# Altium footprint library texas.PCBLIB: 168 footprints (part 11 of 14)
Each footprint in its own frame and in the unit in brackets; x right, y up, seen from the top. Pads: shape width x height; smd on the part's side, far side on the other; paste and mask are expansions set on the pad; w line width, h text height; cw(c..) or ccw(c..) is an arc to the next point about the centre after c.
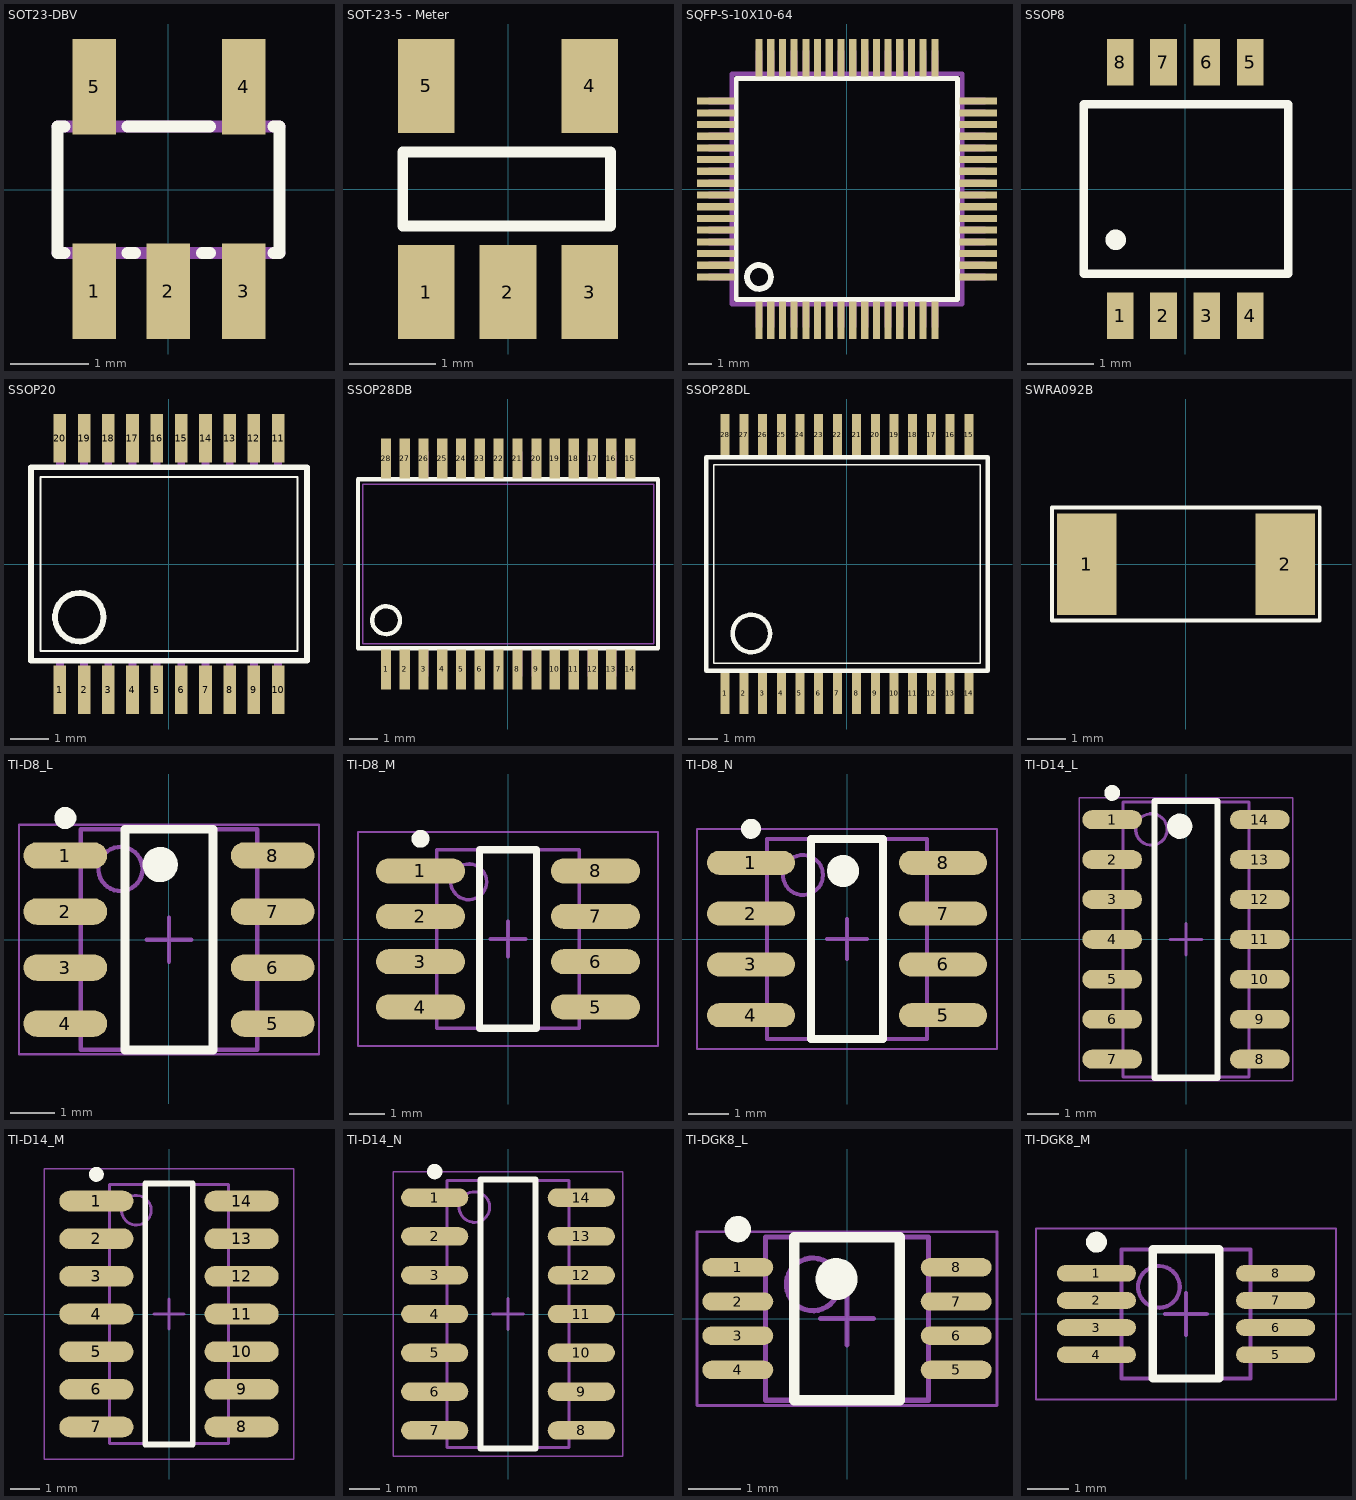
[diagram p10: the footprints below, top view; thin cyan lines are the x and y axes]

## SOT23-DBV [mil]
pads (5):
  rect 22x48 smd: 1(-37.4,-51.18) 2(0,-51.18) 3(38,-51.18) 4(38,52) 5(-37.4,52)
Top Overlay:
  lines w6: -52.28,-31.89 -55.98,-31.89 -55.98,32 -52.28,32 ; -20.55,-31.89 -16.85,-31.89 ; -20.55,32 21,32 ; 17,-31.89 21,-31.89 ; 53,-31.89 56,-31.89 56,32 53,32
Mechanical 4:
  rectangle: -47.24,34 -27.56,60
  rectangle: 28,34 48,60
  rectangle: 28,-59.06 48,-33.46
  rectangle: -9.84,-59.06 10,-33.46
  rectangle: -47.24,-59.06 -27.56,-33.46
  lines w6: -55.98,-31.89 56,-31.89 ; -55.98,32 56,32

## SOT-23-5 - Meter [mm]
pads (5):
  rect 0.66x1.092 smd: 1(-0.95,-1.2) 2(0,-1.2) 3(0.95,-1.2) 4(0.95,1.2) 5(-0.95,1.2)
Top Overlay:
  lines w0.127: -1.225,-0.43 -1.225,0.43 1.194,0.43 1.194,-0.43 -1.225,-0.43
3D body "CircuitWorks-SOT-23-5.step": height 1.07, standoff -0.03, extent -1.495,-1.27 1.505,1.23

## SQFP-S-10X10-64 [mil]
pads (64):
  rect 12x63 smd: 1(-147.64,-220.47) 2(-127.95,-220.47) 3(-108.27,-220.47) 4(-88.58,-220.47) 5(-68.9,-220.47) 6(-49.21,-220.47) 7(-29.53,-220.47) 8(-9.84,-220.47) 9(10,-220.47) 10(30,-220.47) 11(50,-220.47) 12(69,-220.47) 13(89,-220.47) 14(109,-220.47) 15(128,-220.47) 16(148,-220.47) 33(148,221) 34(128,221) 35(109,221) 36(89,221) 37(69,221) 38(50,221) 39(30,221) 40(10,221) 41(-9.84,221) 42(-29.53,221) 43(-49.21,221) 44(-68.9,221) 45(-88.58,221) 46(-108.27,221) 47(-127.95,221) 48(-147.64,221)
  rect 63x12 smd: 17(221,-147.64) 18(221,-127.95) 19(221,-108.27) 20(221,-88.58) 21(221,-68.9) 22(221,-49.21) 23(221,-29.53) 24(221,-9.84) 25(221,10) 26(221,30) 27(221,50) 28(221,69) 29(221,89) 30(221,109) 31(221,128) 32(221,148) 49(-220.47,148) 50(-220.47,128) 51(-220.47,109) 52(-220.47,89) 53(-220.47,69) 54(-220.47,50) 55(-220.47,30) 56(-220.47,10) 57(-220.47,-9.84) 58(-220.47,-29.53) 59(-220.47,-49.21) 60(-220.47,-68.9) 61(-220.47,-88.58) 62(-220.47,-108.27) 63(-220.47,-127.95) 64(-220.47,-147.64)
Top Overlay:
  circle w10: c-147.64,-147.64 r20
  lines w8: -185.83,-185.43 186,-185.43 186,186 -185.83,186 -185.83,-185.43
Mechanical 4:
  rectangle: -153.54,-232.28 -141.73,-194.88
  rectangle: -133.86,-232.28 -122.05,-194.88
  rectangle: -114.17,-232.28 -102.36,-194.88
  rectangle: -94.49,-232.28 -82.68,-194.88
  rectangle: -74.8,-232.28 -62.99,-194.88
  rectangle: -55.12,-232.28 -43.31,-194.88
  rectangle: -35.43,-232.28 -23.62,-194.88
  rectangle: -15.75,-232.28 -3.94,-194.88
  rectangle: 4,-232.28 16,-194.88
  rectangle: 24,-232.28 36,-194.88
  rectangle: 44,-232.28 56,-194.88
  rectangle: 63,-232.28 75,-194.88
  rectangle: 83,-232.28 95,-194.88
  rectangle: 103,-232.28 115,-194.88
  rectangle: 123,-232.28 134,-194.88
  rectangle: 142,-232.28 154,-194.88
  rectangle: 195,-153.54 233,-141.73
  rectangle: 195,-133.86 233,-122.05
  rectangle: 195,-114.17 233,-102.36
  rectangle: 195,-94.49 233,-82.68
  rectangle: 195,-74.8 233,-62.99
  rectangle: 195,-55.12 233,-43.31
  rectangle: 195,-35.43 233,-23.62
  rectangle: 195,-15.75 233,-3.94
  rectangle: 195,4 233,16
  rectangle: 195,24 233,36
  rectangle: 195,44 233,56
  rectangle: 195,63 233,75
  rectangle: 195,83 233,95
  rectangle: 195,103 233,115
  rectangle: 195,123 233,134
  rectangle: 195,142 233,154
  rectangle: 142,195 154,233
  rectangle: 123,195 134,233
  rectangle: 103,195 115,233
  rectangle: 83,195 95,233
  rectangle: 63,195 75,233
  rectangle: 44,195 56,233
  rectangle: 24,195 36,233
  rectangle: 4,195 16,233
  rectangle: -15.75,195 -3.94,233
  rectangle: -35.43,195 -23.62,233
  rectangle: -55.12,195 -43.31,233
  rectangle: -74.8,195 -62.99,233
  rectangle: -94.49,195 -82.68,233
  rectangle: -114.17,195 -102.36,233
  rectangle: -133.86,195 -122.05,233
  rectangle: -153.54,195 -141.73,233
  rectangle: -232.28,142 -194.88,154
  rectangle: -232.28,123 -194.88,134
  rectangle: -232.28,103 -194.88,115
  rectangle: -232.28,83 -194.88,95
  rectangle: -232.28,63 -194.88,75
  rectangle: -232.28,44 -194.88,56
  rectangle: -232.28,24 -194.88,36
  rectangle: -232.28,4 -194.88,16
  rectangle: -232.28,-15.75 -194.88,-3.94
  rectangle: -232.28,-35.43 -194.88,-23.62
  rectangle: -232.28,-55.12 -194.88,-43.31
  rectangle: -232.28,-74.8 -194.88,-62.99
  rectangle: -232.28,-94.49 -194.88,-82.68
  rectangle: -232.28,-114.17 -194.88,-102.36
  rectangle: -232.28,-133.86 -194.88,-122.05
  rectangle: -232.28,-153.54 -194.88,-141.73
  lines w8: -193.31,-193.31 194,-193.31 194,194 -193.31,194 -193.31,-193.31

## SSOP8 [mil]
pads (8):
  rect 15.75x27.56 smd: 1(-38.39,-74.8) 2(-12.8,-74.8) 3(12.8,-74.8) 4(38.39,-74.8) 5(38.39,74.8) 6(12.8,74.8) 7(-12.8,74.8) 8(-38.39,74.8)
Top Overlay:
  circle w10: c-41,-30 r1
  lines w5: -60,-50 -60,50 61.02,50 61.02,-50 -60,-50
3D body "User Library-SOP50P310X90-8N[8US8_VSSOP_DCU_MO-187CA].step": height 50.61, standoff -0.57, extent -61.42,-84.56 62.6,82.76

## SSOP20 [mil]
pads (20):
  rect 13x50 smd: 1(-112.48,-130) 2(-87.48,-130) 3(-62.48,-130) 4(-37.48,-130) 5(-12.48,-130) 6(13,-130) 7(38,-130) 8(63,-130) 9(88,-130) 10(113,-130) 11(113,130) 12(88,130) 13(63,130) 14(38,130) 15(13,130) 16(-12.48,130) 17(-37.48,130) 18(-62.48,130) 19(-87.48,130) 20(-112.48,130)
Top Overlay:
  circle w6: c-92.48,-55 r25
  lines w2: -132.48,-90 -132.48,90 133,90 133,-90 -132.48,-90
  lines w6: -142.48,-100 -142.48,100 143,100 143,-100 -142.48,-100
Mechanical 4:
  rectangle: 109,-135 117,-102
  rectangle: 84,-135 92,-102
  rectangle: 59,-135 67,-102
  rectangle: 34,-135 42,-102
  rectangle: 9,-135 17,-102
  rectangle: -16.48,-135 -8.48,-102
  rectangle: -41.48,-135 -33.48,-102
  rectangle: -66.48,-135 -58.48,-102
  rectangle: -91.48,-135 -83.48,-102
  rectangle: -116.48,-135 -108.48,-102
  rectangle: -116.48,102 -108.48,135
  rectangle: -91.48,102 -83.48,135
  rectangle: -66.48,102 -58.48,135
  rectangle: -41.48,102 -33.48,135
  rectangle: -16.48,102 -8.48,135
  rectangle: 9,102 17,135
  rectangle: 34,102 42,135
  rectangle: 59,102 67,135
  rectangle: 84,102 92,135
  rectangle: 109,102 117,135

## SSOP28DB [mil]
pads (28):
  rect 14x55 smd: 1(-166.34,-143.94) 2(-140.75,-143.94) 3(-115.16,-143.94) 4(-89.57,-143.94) 5(-63.98,-143.94) 6(-38.39,-143.94) 7(-12.8,-143.94) 8(13,-143.94) 9(39,-143.94) 10(64,-143.94) 11(90,-143.94) 12(116,-143.94) 13(141,-143.94) 14(167,-143.94) 15(167,144) 16(141,144) 17(116,144) 18(90,144) 19(64,144) 20(39,144) 21(13,144) 22(-12.8,144) 23(-38.39,144) 24(-63.98,144) 25(-89.57,144) 26(-115.16,144) 27(-140.75,144) 28(-166.34,144)
Top Overlay:
  circle w6: c-166.34,-76.77 r19
  lines w6: -204.72,-115.16 205,-115.16 205,116 -204.72,116 -204.72,-115.16
Mechanical 4:
  rectangle: -172.74,117 -159.94,154
  rectangle: -172.74,-153.54 -159.94,-116.76
  rectangle: -147.15,-153.54 -134.35,-116.76
  rectangle: -121.56,-153.54 -108.76,-116.76
  rectangle: -147.15,117 -134.35,154
  rectangle: -121.56,117 -108.76,154
  rectangle: -95.96,117 -83.17,154
  rectangle: -70.37,117 -57.58,154
  rectangle: -44.78,117 -31.99,154
  rectangle: -19.19,117 -6.4,154
  rectangle: 7,117 20,154
  rectangle: 32,117 45,154
  rectangle: 58,117 71,154
  rectangle: 84,117 96,154
  rectangle: 109,117 122,154
  rectangle: 135,117 148,154
  rectangle: 160,117 173,154
  rectangle: -95.96,-153.54 -83.17,-116.76
  rectangle: -70.37,-153.54 -57.58,-116.76
  rectangle: -44.78,-153.54 -31.99,-116.76
  rectangle: -19.19,-153.54 -6.4,-116.76
  rectangle: 7,-153.54 20,-116.76
  rectangle: 32,-153.54 45,-116.76
  rectangle: 58,-153.54 71,-116.76
  rectangle: 84,-153.54 96,-116.76
  rectangle: 109,-153.54 122,-116.76
  rectangle: 135,-153.54 148,-116.76
  rectangle: 160,-153.54 173,-116.76
  lines w2: -198.35,-108.78 199,-108.78 199,109 -198.35,109 -198.35,-108.78

## SSOP28DL [mil]
pads (28):
  rect 12x55 smd: 1(-162.5,-172.5) 2(-137.5,-172.5) 3(-112.5,-172.5) 4(-87.5,-172.5) 5(-62.5,-172.5) 6(-37.5,-172.5) 7(-12.5,-172.5) 8(13,-172.5) 9(38,-172.5) 10(63,-172.5) 11(88,-172.5) 12(113,-172.5) 13(138,-172.5) 14(163,-172.5) 15(163,173) 16(138,173) 17(113,173) 18(88,173) 19(63,173) 20(38,173) 21(13,173) 22(-12.5,173) 23(-37.5,173) 24(-62.5,173) 25(-87.5,173) 26(-112.5,173) 27(-137.5,173) 28(-162.5,173)
Top Overlay:
  circle w6: c-127.5,-92.5 r25
  lines w2: -177.52,-132.52 -177.52,133 178,133 178,-132.52 -177.52,-132.52
  lines w6: -187.52,-142.52 -187.52,143 188,143 188,-142.52 -187.52,-142.52
Mechanical 4:
  rectangle: -166.5,-177.5 -158.5,-144.5
  rectangle: -141.5,-177.5 -133.5,-144.5
  rectangle: -116.5,-177.5 -108.5,-144.5
  rectangle: -91.5,-177.5 -83.5,-144.5
  rectangle: -66.5,-177.5 -58.5,-144.5
  rectangle: -41.5,-177.5 -33.5,-144.5
  rectangle: -16.5,-177.5 -8.5,-144.5
  rectangle: 9,-177.5 17,-144.5
  rectangle: 34,-177.5 42,-144.5
  rectangle: 59,-177.5 67,-144.5
  rectangle: 84,-177.5 92,-144.5
  rectangle: 109,-177.5 117,-144.5
  rectangle: 134,-177.5 142,-144.5
  rectangle: 159,-177.5 167,-144.5
  rectangle: 159,145 167,178
  rectangle: 134,145 142,178
  rectangle: 109,145 117,178
  rectangle: 84,145 92,178
  rectangle: 59,145 67,178
  rectangle: 34,145 42,178
  rectangle: 9,145 17,178
  rectangle: -16.5,145 -8.5,178
  rectangle: -41.5,145 -33.5,178
  rectangle: -66.5,145 -58.5,178
  rectangle: -91.5,145 -83.5,178
  rectangle: -116.5,145 -108.5,178
  rectangle: -141.5,145 -133.5,178
  rectangle: -166.5,145 -158.5,178

## SWRA092B [mil]
pads (2):
  rect 60x103 smd: 1(-100.39,0) 2(101,0)
Top Overlay:
  lines w4: -135.83,-57.09 -135.83,58 136,58 136,-57.09 -135.83,-57.09

## TI-D8_L [mm] "SOIC, 8-Leads, Body 4.9x3.9mm, Pitch 1.27mm, IPC High Density"
height 1.75
pads (8):
  oval 1.9x0.6 smd: 1(-2.35,1.905) 2(-2.35,0.635) 3(-2.35,-0.635) 4(-2.35,-1.905) 5(2.35,-1.905) 6(2.35,-0.635) 7(2.35,0.635) 8(2.35,1.905)
Top Overlay:
  circle w0.4: c-0.2,1.7 r0.2
  circle w0.25: c-2.35,2.755 r0.125
  lines w0.2: -1,-2.5 1,-2.5 1,2.5 -1,2.5 -1,-2.5
Mechanical 13:
  circle w0.1: c-1.1,1.6 r0.5
  lines w0.1: -2,-2.5 2,-2.5 2,2.5 -2,2.5 -2,-2.5
Mechanical 15:
  lines w0.05: -3.4,-2.6 3.4,-2.6 3.4,2.6 -3.4,2.6 -3.4,-2.6
  lines w0.1: -0.5,0 0.5,0 ; 0,-0.5 0,0.5
3D body: height 1.75, standoff 0.1, extent -2,-2.5 2,2.5

## TI-D8_M [mm] "SOIC, 8-Leads, Body 4.9x3.9mm, Pitch 1.27mm, IPC Low Density"
height 1.75
pads (8):
  oval 2.5x0.7 smd: 1(-2.45,1.905) 2(-2.45,0.635) 3(-2.45,-0.635) 4(-2.45,-1.905) 5(2.45,-1.905) 6(2.45,-0.635) 7(2.45,0.635) 8(2.45,1.905)
Top Overlay:
  circle w0.25: c-2.45,2.805 r0.125
  lines w0.2: -0.8,-2.5 0.8,-2.5 0.8,2.5 -0.8,2.5 -0.8,-2.5
Mechanical 13:
  circle w0.1: c-1.1,1.6 r0.5
  lines w0.1: -2,-2.5 2,-2.5 2,2.5 -2,2.5 -2,-2.5
Mechanical 15:
  lines w0.05: -4.2,-3 4.2,-3 4.2,3 -4.2,3 -4.2,-3
  lines w0.1: -0.5,0 0.5,0 ; 0,-0.5 0,0.5
3D body: height 1.75, standoff 0.1, extent -2,-2.5 2,2.5

## TI-D8_N [mm] "SOIC, 8-Leads, Body 4.9x3.9mm, Pitch 1.27mm, IPC Medium Density"
height 1.75
pads (8):
  oval 2.2x0.6 smd: 1(-2.4,1.905) 2(-2.4,0.635) 3(-2.4,-0.635) 4(-2.4,-1.905) 5(2.4,-1.905) 6(2.4,-0.635) 7(2.4,0.635) 8(2.4,1.905)
Top Overlay:
  circle w0.25: c-2.4,2.755 r0.125
  circle w0.4: c-0.1,1.7 r0.2
  lines w0.2: -0.9,-2.5 -0.9,2.5 0.9,2.5 0.9,-2.5 -0.9,-2.5
Mechanical 13:
  circle w0.1: c-1.1,1.6 r0.5
  lines w0.1: -2,-2.5 -2,2.5 2,2.5 2,-2.5 -2,-2.5
Mechanical 15:
  lines w0.05: -3.75,-2.75 -3.75,2.75 3.75,2.75 3.75,-2.75 -3.75,-2.75
  lines w0.1: -0.5,0 0.5,0 ; 0,-0.5 0,0.5
3D body: height 1.75, standoff 0.1, extent -2,-2.5 2,2.5

## TI-D14_L [mm] "SOIC, 14-Leads, Body 8.65x3.9mm, Pitch 1.27mm, IPC High Density"
height 1.75
pads (14):
  oval 1.9x0.6 smd: 1(-2.35,3.81) 2(-2.35,2.54) 3(-2.35,1.27) 4(-2.35,0) 5(-2.35,-1.27) 6(-2.35,-2.54) 7(-2.35,-3.81) 8(2.35,-3.81) 9(2.35,-2.54) 10(2.35,-1.27) 11(2.35,0) 12(2.35,1.27) 13(2.35,2.54) 14(2.35,3.81)
Top Overlay:
  circle w0.4: c-0.2,3.6 r0.2
  circle w0.25: c-2.35,4.66 r0.125
  lines w0.2: -1,-4.4 1,-4.4 1,4.4 -1,4.4 -1,-4.4
Mechanical 13:
  circle w0.1: c-1.1,3.5 r0.5
  lines w0.1: -2,-4.375 2,-4.375 2,4.375 -2,4.375 -2,-4.375
Mechanical 15:
  lines w0.05: -3.4,-4.5 3.4,-4.5 3.4,4.5 -3.4,4.5 -3.4,-4.5
  lines w0.1: -0.5,0 0.5,0 ; 0,-0.5 0,0.5
3D body: height 1.75, standoff 0.1, extent -2,-4.375 2,4.375

## TI-D14_M [mm] "SOIC, 14-Leads, Body 8.65x3.9mm, Pitch 1.27mm, IPC Low Density"
height 1.75
pads (14):
  oval 2.5x0.7 smd: 1(-2.45,3.81) 2(-2.45,2.54) 3(-2.45,1.27) 4(-2.45,0) 5(-2.45,-1.27) 6(-2.45,-2.54) 7(-2.45,-3.81) 8(2.45,-3.81) 9(2.45,-2.54) 10(2.45,-1.27) 11(2.45,0) 12(2.45,1.27) 13(2.45,2.54) 14(2.45,3.81)
Top Overlay:
  circle w0.25: c-2.45,4.71 r0.125
  lines w0.2: -0.8,-4.4 0.8,-4.4 0.8,4.4 -0.8,4.4 -0.8,-4.4
Mechanical 13:
  circle w0.1: c-1.1,3.5 r0.5
  lines w0.1: -2,-4.375 2,-4.375 2,4.375 -2,4.375 -2,-4.375
Mechanical 15:
  lines w0.05: -4.2,-4.9 4.2,-4.9 4.2,4.9 -4.2,4.9 -4.2,-4.9
  lines w0.1: -0.5,0 0.5,0 ; 0,-0.5 0,0.5
3D body: height 1.75, standoff 0.1, extent -2,-4.375 2,4.375

## TI-D14_N [mm] "SOIC, 14-Leads, Body 8.65x3.9mm, Pitch 1.27mm, IPC Medium Density"
height 1.75
pads (14):
  oval 2.2x0.6 smd: 1(-2.4,3.81) 2(-2.4,2.54) 3(-2.4,1.27) 4(-2.4,0) 5(-2.4,-1.27) 6(-2.4,-2.54) 7(-2.4,-3.81) 8(2.4,-3.81) 9(2.4,-2.54) 10(2.4,-1.27) 11(2.4,0) 12(2.4,1.27) 13(2.4,2.54) 14(2.4,3.81)
Top Overlay:
  circle w0.25: c-2.4,4.66 r0.125
  lines w0.2: -0.9,-4.4 0.9,-4.4 0.9,4.4 -0.9,4.4 -0.9,-4.4
Mechanical 13:
  circle w0.1: c-1.1,3.5 r0.5
  lines w0.1: -2,-4.375 2,-4.375 2,4.375 -2,4.375 -2,-4.375
Mechanical 15:
  lines w0.05: -3.75,-4.65 3.75,-4.65 3.75,4.65 -3.75,4.65 -3.75,-4.65
  lines w0.1: -0.5,0 0.5,0 ; 0,-0.5 0,0.5
3D body: height 1.75, standoff 0.1, extent -2,-4.375 2,4.375

## TI-DGK8_L [mm] "SOP, 8-Leads, Body 3x3mm, Pitch 0.65mm, IPC High Density"
height 1.1
pads (8):
  oval 1.35x0.35 smd: 1(-2.075,0.975) 2(-2.075,0.325) 3(-2.075,-0.325) 4(-2.075,-0.975) 5(2.075,-0.975) 6(2.075,-0.325) 7(2.075,0.325) 8(2.075,0.975)
Top Overlay:
  circle w0.4: c-0.2,0.75 r0.2
  circle w0.25: c-2.075,1.7 r0.125
  lines w0.2: -1,-1.55 1,-1.55 1,1.55 -1,1.55 -1,-1.55
Mechanical 13:
  circle w0.1: c-0.65,0.65 r0.5
  lines w0.1: -1.55,-1.55 1.55,-1.55 1.55,1.55 -1.55,1.55 -1.55,-1.55
Mechanical 15:
  lines w0.05: -2.85,-1.65 2.85,-1.65 2.85,1.65 -2.85,1.65 -2.85,-1.65
  lines w0.1: -0.5,0 0.5,0 ; 0,-0.5 0,0.5
3D body: height 1.1, standoff 0.05, extent -1.55,-1.55 1.55,1.55

## TI-DGK8_M [mm] "SOP, 8-Leads, Body 3x3mm, Pitch 0.65mm, IPC Low Density"
height 1.1
pads (8):
  oval 1.9x0.4 smd: 1(-2.15,0.975) 2(-2.15,0.325) 3(-2.15,-0.325) 4(-2.15,-0.975) 5(2.15,-0.975) 6(2.15,-0.325) 7(2.15,0.325) 8(2.15,0.975)
Top Overlay:
  circle w0.25: c-2.15,1.725 r0.125
  lines w0.2: -0.8,-1.55 0.8,-1.55 0.8,1.55 -0.8,1.55 -0.8,-1.55
Mechanical 13:
  circle w0.1: c-0.65,0.65 r0.5
  lines w0.1: -1.55,-1.55 1.55,-1.55 1.55,1.55 -1.55,1.55 -1.55,-1.55
Mechanical 15:
  lines w0.05: -3.6,-2.05 3.6,-2.05 3.6,2.05 -3.6,2.05 -3.6,-2.05
  lines w0.1: -0.5,0 0.5,0 ; 0,-0.5 0,0.5
3D body: height 1.1, standoff 0.05, extent -1.55,-1.55 1.55,1.55